# Altium footprint library Vowstar_IC_General.PcbLib: 139 footprints (part 1 of 9)
Each footprint in its own frame and in the unit in brackets; x right, y up, seen from the top. Pads: shape width x height; smd on the part's side, far side on the other; paste and mask are expansions set on the pad; w line width, h text height; cw(c..) or ccw(c..) is an arc to the next point about the centre after c.
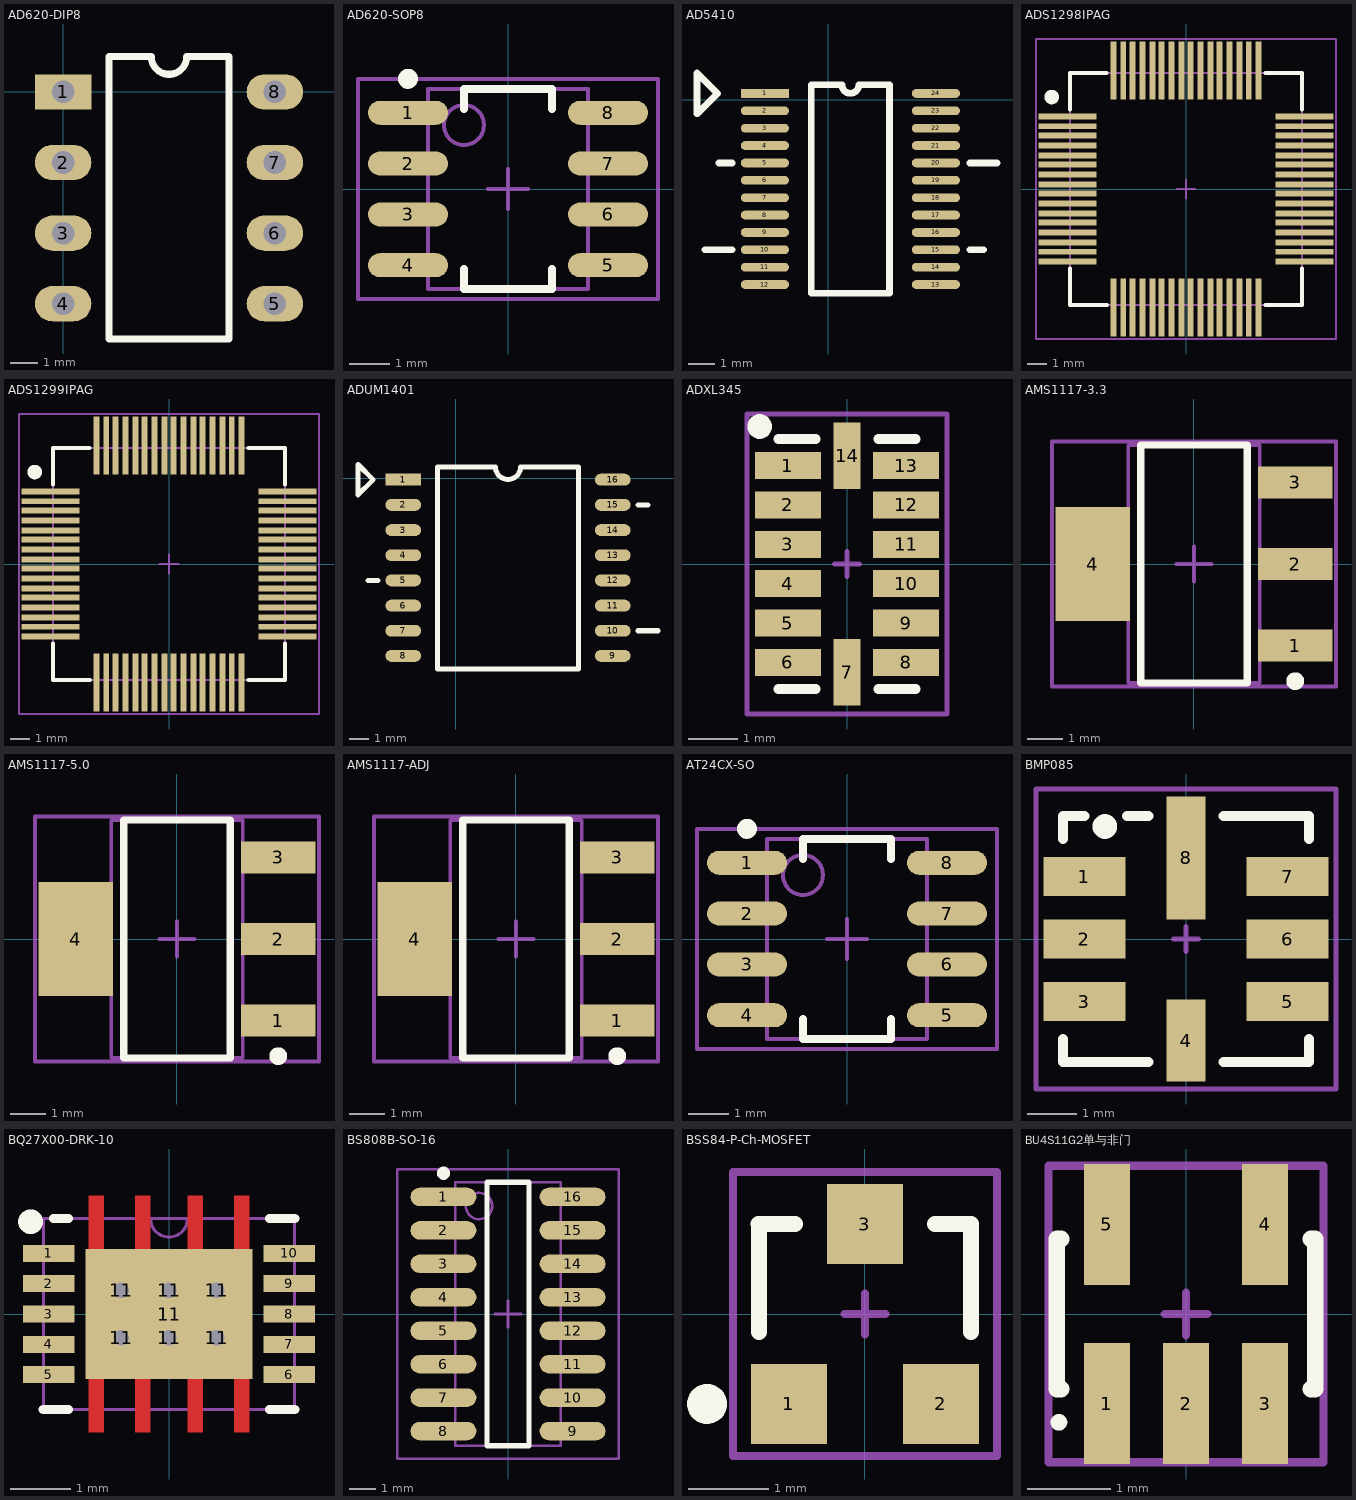
[diagram p0: the footprints below, top view; thin cyan lines are the x and y axes]

## AD620-DIP8 [mil] "AD620-DIP8"
pads (8):
  rect 80x50 hole 32: 1(0,0)
  oval 80x50 hole 32: 2(0,-100) 3(0,-200) 4(0,-300) 5(300,-300) 6(300,-200) 7(300,-100) 8(300,0)
Top Overlay:
  lines w10: 65,-350 235,-350 235,50 175,50 cw(c150,50) 125,50 65,50 65,-350
3D body "User Library-DIP-8-300-metric.step": height 177.17, standoff -137.8, extent -3,-362.6 302.54,62.6

## AD620-SOP8 [mm] "AD620-SOP8"
height 1.5
pads (8):
  oval 2x0.6 smd: 1(-2.5,1.905) 2(-2.5,0.635) 3(-2.5,-0.635) 4(-2.5,-1.905) 5(2.5,-1.905) 6(2.5,-0.635) 7(2.5,0.635) 8(2.5,1.905)
Top Overlay:
  circle w0.25: c-2.5,2.755 r0.125
  lines w0.2: -1.1,-2 -1.1,-2.5 1.1,-2.5 1.1,-2 ; -1.1,2 -1.1,2.5 1.1,2.5 1.1,2
Mechanical 13:
  circle w0.1: c-1.1,1.6 r0.5
  lines w0.1: -2,-2.5 2,-2.5 2,2.5 -2,2.5 -2,-2.5
Mechanical 15:
  lines w0.1: -0.5,0 0.5,0 ; 0,-0.5 0,0.5 ; -3.75,-2.75 3.75,-2.75 3.75,2.75 -3.75,2.75 -3.75,-2.75
3D body "User Library-SOP-8.step": height 1.45, standoff 0, extent -2.921,-2.451 2.857,2.451

## AD5410 [mm]
pads (24):
  rect 1.8x0.33 smd: 1(-2.371,0.238)
  oval 1.8x0.33 smd: 2(-2.371,-0.412) 3(-2.371,-1.062) 4(-2.371,-1.712) 5(-2.371,-2.362) 6(-2.371,-3.012) 7(-2.371,-3.662) 8(-2.371,-4.312) 9(-2.371,-4.962) 10(-2.371,-5.612) 11(-2.371,-6.262) 12(-2.371,-6.912) 13(4.029,-6.912) 14(4.029,-6.262) 15(4.029,-5.612) 16(4.029,-4.962) 17(4.029,-4.312) 18(4.029,-3.662) 19(4.029,-3.012) 20(4.029,-2.362) 21(4.029,-1.712) 22(4.029,-1.062) 23(4.029,-0.412) 24(4.029,0.238)
Top Overlay:
  lines w0.254: -4.607,-5.612 -3.591,-5.612 ; -4.099,-2.362 -3.591,-2.362 ; 5.299,-5.612 5.807,-5.612 ; 5.299,-2.362 6.315,-2.362 ; -4.911,-0.524 -4.149,0.238 -4.911,1 -4.911,-0.524 ; -0.636,-7.237 -0.636,0.563 0.511,0.563 ccw(c0.829,0.563) 1.146,0.563 2.294,0.563 2.294,-7.237 -0.636,-7.237

## ADS1298IPAG [mil] "ADS1298IPAG"
height 41.34
pads (64):
  rect 118x12 smd: 1(-240.5,147.5) 2(-240.5,127.5) 3(-240.5,108.5) 4(-240.5,88.5) 5(-240.5,68.5) 6(-240.5,49.5) 7(-240.5,29.5) 8(-240.5,9.5) 9(-240.5,-9.5) 10(-240.5,-29.5) 11(-240.5,-49.5) 12(-240.5,-68.5) 13(-240.5,-88.5) 14(-240.5,-108.5) 15(-240.5,-127.5) 16(-240.5,-147.5) 33(240.5,-147.5) 34(240.5,-127.5) 35(240.5,-108.5) 36(240.5,-88.5) 37(240.5,-68.5) 38(240.5,-49.5) 39(240.5,-29.5) 40(240.5,-9.5) 41(240.5,9.5) 42(240.5,29.5) 43(240.5,49.5) 44(240.5,68.5) 45(240.5,88.5) 46(240.5,108.5) 47(240.5,127.5) 48(240.5,147.5)
  rect 12x118 smd: 17(-147.5,-240.5) 18(-127.5,-240.5) 19(-108.5,-240.5) 20(-88.5,-240.5) 21(-68.5,-240.5) 22(-49.5,-240.5) 23(-29.5,-240.5) 24(-9.5,-240.5) 25(9.5,-240.5) 26(29.5,-240.5) 27(49.5,-240.5) 28(68.5,-240.5) 29(88.5,-240.5) 30(108.5,-240.5) 31(127.5,-240.5) 32(147.5,-240.5) 49(147.5,240.5) 50(127.5,240.5) 51(108.5,240.5) 52(88.5,240.5) 53(68.5,240.5) 54(49.5,240.5) 55(29.5,240.5) 56(9.5,240.5) 57(-9.5,240.5) 58(-29.5,240.5) 59(-49.5,240.5) 60(-68.5,240.5) 61(-88.5,240.5) 62(-108.5,240.5) 63(-127.5,240.5) 64(-147.5,240.5)
Top Overlay:
  circle w19.68: c-273,187 r4.92
  lines w7.87: -236.22,-161.22 -236.22,-236.22 -160,-236.22 ; -236.22,161.22 -236.22,236.22 -161.22,236.22 ; 161.22,-236.22 236.22,-236.22 236.22,-161.22 ; 161.22,236.22 236.22,236.22 236.22,161.22
Mechanical 13:
  lines w3.94: -236.22,-236.22 236.22,-236.22 236.22,236.22 -236.22,236.22 -236.22,-236.22
Mechanical 15:
  lines w3.94: -19.69,0 19.68,0 ; 0,-19.68 0,19.69 ; -305,-305 305,-305 305,305 -305,305 -305,-305
3D body "User Library-QFP-64.step": height 53.15, standoff 0, extent -236.77,-236.76 236.77,236.77

## ADS1299IPAG [mil] "ADS1299IPAG,Low-Noise, 8-Channel, 24-Bit Analog Front-End for Biopotential Measurements"
height 41.34
pads (64):
  rect 118x12 smd: 1(-240.5,147.5) 2(-240.5,127.5) 3(-240.5,108.5) 4(-240.5,88.5) 5(-240.5,68.5) 6(-240.5,49.5) 7(-240.5,29.5) 8(-240.5,9.5) 9(-240.5,-9.5) 10(-240.5,-29.5) 11(-240.5,-49.5) 12(-240.5,-68.5) 13(-240.5,-88.5) 14(-240.5,-108.5) 15(-240.5,-127.5) 16(-240.5,-147.5) 33(240.5,-147.5) 34(240.5,-127.5) 35(240.5,-108.5) 36(240.5,-88.5) 37(240.5,-68.5) 38(240.5,-49.5) 39(240.5,-29.5) 40(240.5,-9.5) 41(240.5,9.5) 42(240.5,29.5) 43(240.5,49.5) 44(240.5,68.5) 45(240.5,88.5) 46(240.5,108.5) 47(240.5,127.5) 48(240.5,147.5)
  rect 12x118 smd: 17(-147.5,-240.5) 18(-127.5,-240.5) 19(-108.5,-240.5) 20(-88.5,-240.5) 21(-68.5,-240.5) 22(-49.5,-240.5) 23(-29.5,-240.5) 24(-9.5,-240.5) 25(9.5,-240.5) 26(29.5,-240.5) 27(49.5,-240.5) 28(68.5,-240.5) 29(88.5,-240.5) 30(108.5,-240.5) 31(127.5,-240.5) 32(147.5,-240.5) 49(147.5,240.5) 50(127.5,240.5) 51(108.5,240.5) 52(88.5,240.5) 53(68.5,240.5) 54(49.5,240.5) 55(29.5,240.5) 56(9.5,240.5) 57(-9.5,240.5) 58(-29.5,240.5) 59(-49.5,240.5) 60(-68.5,240.5) 61(-88.5,240.5) 62(-108.5,240.5) 63(-127.5,240.5) 64(-147.5,240.5)
Top Overlay:
  circle w19.68: c-273,187 r4.92
  lines w7.87: -236.22,-161.22 -236.22,-236.22 -160,-236.22 ; -236.22,161.22 -236.22,236.22 -161.22,236.22 ; 161.22,-236.22 236.22,-236.22 236.22,-161.22 ; 161.22,236.22 236.22,236.22 236.22,161.22
Mechanical 13:
  lines w3.94: -236.22,-236.22 -236.22,236.22 236.22,236.22 236.22,-236.22 -236.22,-236.22
Mechanical 15:
  lines w3.94: -19.69,0 19.68,0 ; 0,-19.68 0,19.69 ; -305,-305 -305,305 305,305 305,-305 -305,-305
3D body "User Library-QFP-64.step": height 53.15, standoff 0, extent -236.77,-236.76 236.77,236.77

## ADUM1401 [mm] "ADUM1401"
pads (16):
  rect 1.8x0.6 smd: 1(-2.65,-0.083)
  oval 1.8x0.6 smd: 2(-2.65,-1.353) 3(-2.65,-2.623) 4(-2.65,-3.893) 5(-2.65,-5.163) 6(-2.65,-6.433) 7(-2.65,-7.703) 8(-2.65,-8.973) 9(7.91,-8.973) 10(7.91,-7.703) 11(7.91,-6.433) 12(7.91,-5.163) 13(7.91,-3.893) 14(7.91,-2.623) 15(7.91,-1.353) 16(7.91,-0.083)
Top Overlay:
  lines w0.254: -4.428,-5.163 -3.92,-5.163 ; 9.18,-7.703 10.196,-7.703 ; 9.18,-1.353 9.688,-1.353 ; -4.936,-0.845 -4.174,-0.083 -4.936,0.679 -4.936,-0.845 ; -0.915,-9.623 6.175,-9.623 6.175,0.567 3.265,0.567 cw(c2.63,0.567) 1.995,0.567 -0.915,0.567 -0.915,-9.623

## ADXL345 [mm] "ADXL345 SMD Digital Accelerometer"
height 1
pads (14):
  rect 1.345x0.55 smd: 1(-1.199,2) 2(-1.199,1.2) 3(-1.199,0.4) 4(-1.199,-0.4) 5(-1.199,-1.2) 6(-1.199,-2) 8(1.199,-2) 9(1.199,-1.2) 10(1.199,-0.4) 11(1.199,0.4) 12(1.199,1.2) 13(1.199,2)
  rect 0.55x1.345 smd: 7(0,-2.199) 14(0,2.199)
Top Overlay:
  circle w0.25: c-1.776,2.794 r0.125
  lines w0.2: -1.397,-2.54 -0.635,-2.54 ; -1.397,2.54 -0.635,2.54 ; 0.635,-2.54 1.397,-2.54 ; 0.635,2.54 1.397,2.54
Mechanical 15:
  lines w0.1: -0.254,0 0.254,0 ; 0,-0.254 0,0.254 ; -2.032,-3.048 2.032,-3.048 2.032,3.048 -2.032,3.048 -2.032,-3.048
3D body "User Library-LGA-14-1.step": height 0.98, standoff 0, extent -1.501,-2.5 1.499,2.5

## AMS1117-3.3 [mm] "AMS1117-3.3"
height 1.8
pads (4):
  rect 2.1x0.9 smd: 1(2.85,-2.3) 2(2.85,0) 3(2.85,2.3)
  rect 2.1x3.2 smd: 4(-2.85,0)
Top Overlay:
  circle w0.25: c2.85,-3.3 r0.125
  lines w0.2: -1.5,-3.35 -1.5,3.35 1.5,3.35 1.5,-3.35 -1.5,-3.35
Mechanical 13:
  lines w0.1: -1.85,-3.35 -1.85,3.35 1.85,3.35 1.85,-3.35 -1.85,-3.35
Mechanical 15:
  lines w0.1: -0.5,0 0.5,0 ; 0,-0.5 0,0.5 ; -4,-3.45 -4,3.45 4,3.45 4,-3.45 -4,-3.45
3D body "User Library-AMS1117-SOT223.step": height 1.82, standoff -0.04, extent -3.531,-3.25 3.469,3.25

## AMS1117-5.0 [mm] "AMS1117-5.0"
height 1.8
pads (4):
  rect 2.1x0.9 smd: 1(2.85,-2.3) 2(2.85,0) 3(2.85,2.3)
  rect 2.1x3.2 smd: 4(-2.85,0)
Top Overlay:
  circle w0.25: c2.85,-3.3 r0.125
  lines w0.2: -1.5,-3.35 1.5,-3.35 1.5,3.35 -1.5,3.35 -1.5,-3.35
Mechanical 13:
  lines w0.1: -1.85,-3.35 1.85,-3.35 1.85,3.35 -1.85,3.35 -1.85,-3.35
Mechanical 15:
  lines w0.1: -0.5,0 0.5,0 ; 0,-0.5 0,0.5 ; -4,-3.45 4,-3.45 4,3.45 -4,3.45 -4,-3.45
3D body "User Library-AMS1117-SOT223.step": height 1.82, standoff -0.04, extent -3.531,-3.25 3.469,3.25

## AMS1117-ADJ [mm] "AMS1117-ADJ"
height 1.8
pads (4):
  rect 2.1x0.9 smd: 1(2.85,-2.3) 2(2.85,0) 3(2.85,2.3)
  rect 2.1x3.2 smd: 4(-2.85,0)
Top Overlay:
  circle w0.25: c2.85,-3.3 r0.125
  lines w0.2: -1.5,-3.35 -1.5,3.35 1.5,3.35 1.5,-3.35 -1.5,-3.35
Mechanical 13:
  lines w0.1: -1.85,-3.35 -1.85,3.35 1.85,3.35 1.85,-3.35 -1.85,-3.35
Mechanical 15:
  lines w0.1: -0.5,0 0.5,0 ; 0,-0.5 0,0.5 ; -4,-3.45 -4,3.45 4,3.45 4,-3.45 -4,-3.45
3D body "User Library-AMS1117-SOT223.step": height 1.82, standoff -0.04, extent -3.531,-3.25 3.469,3.25

## AT24CX-SO [mm] "AT24CX"
pads (8):
  oval 2x0.6 smd: 1(-2.5,1.905) 2(-2.5,0.635) 3(-2.5,-0.635) 4(-2.5,-1.905) 5(2.5,-1.905) 6(2.5,-0.635) 7(2.5,0.635) 8(2.5,1.905)
Top Overlay:
  circle w0.25: c-2.5,2.755 r0.125
  lines w0.2: -1.1,-2 -1.1,-2.5 1.1,-2.5 1.1,-2 ; -1.1,2 -1.1,2.5 1.1,2.5 1.1,2
Mechanical 13:
  circle w0.1: c-1.1,1.6 r0.5
  lines w0.1: -2,-2.5 -2,2.5 2,2.5 2,-2.5 -2,-2.5
Mechanical 15:
  lines w0.1: -0.5,0 0.5,0 ; 0,-0.5 0,0.5 ; -3.75,-2.75 -3.75,2.75 3.75,2.75 3.75,-2.75 -3.75,-2.75
3D body "User Library-SOP-8.step": height 1.45, standoff 0, extent -2.921,-2.451 2.857,2.451

## BMP085 [mm] "BMP085 SMD Digital barometric pressure sensor"
height 1.32
pads (8):
  rect 1.67x0.8 smd: 1(-2.065,1.27) 2(-2.065,0) 3(-2.065,-1.27) 5(2.065,-1.27) 6(2.065,0) 7(2.065,1.27)
  rect 0.8x1.67 smd: 4(0,-2.065)
  rect 0.8x2.5 smd: 8(0,1.65)
Top Overlay:
  circle w0.25: c-1.649,2.286 r0.125
  lines w0.2: -2.5,-2.032 -2.5,-2.5 -0.762,-2.5 ; -2.5,2.032 -2.5,2.5 -2.066,2.5 ; -1.197,2.5 -0.762,2.5 ; 0.762,-2.5 2.5,-2.5 2.5,-2.032 ; 0.762,2.5 2.5,2.5 2.5,2.032
Mechanical 15:
  lines w0.1: -0.254,0 0.254,0 ; 0,-0.254 0,0.254 ; -3.048,-3.048 -3.048,3.048 3.048,3.048 3.048,-3.048 -3.048,-3.048
3D body "User Library-BMP085-Barometer.step": height 1.22, standoff 0.01, extent -2.5,-2.46 2.5,2.54

## BQ27X00-DRK-10 [mm] "BQ27200,BQ27000 DRK(S-PVSON-N10)"
height 1
pads (17):
  rect 0.85x0.28 smd paste-0.412: 1(-1.981,1) 2(-1.981,0.5) 3(-1.981,0) 4(-1.981,-0.5) 5(-1.981,-1) 6(1.981,-1) 7(1.981,-0.5) 8(1.981,0) 9(1.981,0.5) 10(1.981,1)
  round 0.508 / inner round 1.524 / far side round 0.508 hole 0.254: 11(-0.787,-0.394) 11(-0.787,0.394) 11(0,-0.394) 11(0,0.394) 11(0.787,-0.394) 11(0.787,0.394)
  rect 2.75x2.15 smd paste-1.362 mask-1.359: 11(0,0)
Top Layer:
  region: -0.31,1.95 -0.31,1.075 -0.56,1.075 -0.56,1.95
  region: 0.31,1.95 0.31,1.075 0.56,1.075 0.56,1.95
  region: -1.075,1.95 -1.075,1.075 -1.325,1.075 -1.325,1.95
  region: 1.075,1.95 1.075,1.075 1.325,1.075 1.325,1.95
  region: -0.31,-1.95 -0.31,-1.075 -0.56,-1.075 -0.56,-1.95
  region: 0.31,-1.95 0.31,-1.075 0.56,-1.075 0.56,-1.95
  region: -1.075,-1.95 -1.075,-1.075 -1.325,-1.075 -1.325,-1.95
  region: 1.075,-1.95 1.075,-1.075 1.325,-1.075 1.325,-1.95
Top Overlay:
  circle w0.254: c-2.286,1.524 r0.076
  lines w0.152: -2.075,-1.575 -1.658,-1.575 ; -1.905,1.575 -1.658,1.575 ; 1.658,-1.575 2.075,-1.575 ; 1.658,1.575 2.075,1.575
Top Paste:
  drawing of 30 lines, arcs and shapes, not listed
Top Solder:
  region: -1.486,1.21 -2.476,1.21 -2.476,0.79 -1.486,0.79
  region: -1.486,0.71 -2.476,0.71 -2.476,0.29 -1.486,0.29
  region: -1.486,0.21 -2.476,0.21 -2.476,-0.21 -1.486,-0.21
  region: -1.486,-0.29 -2.476,-0.29 -2.476,-0.71 -1.486,-0.71
  region: -1.486,-0.79 -2.476,-0.79 -2.476,-1.21 -1.486,-1.21
  region: 2.476,-0.79 1.486,-0.79 1.486,-1.21 2.476,-1.21
  region: 2.476,-0.29 1.486,-0.29 1.486,-0.71 2.476,-0.71
  region: 2.476,0.21 1.486,0.21 1.486,-0.21 2.476,-0.21
  region: 2.476,0.71 1.486,0.71 1.486,0.29 2.476,0.29
  region: 2.476,1.21 1.486,1.21 1.486,0.79 2.476,0.79
  region: -0.31,1.95 -0.31,1.075 -0.56,1.075 -0.56,1.95
  region: 0.31,1.95 0.31,1.075 0.56,1.075 0.56,1.95
  region: -1.075,1.95 -1.075,1.075 -1.325,1.075 -1.325,1.95
  region: 1.075,1.95 1.075,1.075 1.325,1.075 1.325,1.95
  region: -0.31,-1.95 -0.31,-1.075 -0.56,-1.075 -0.56,-1.95
  region: 0.31,-1.95 0.31,-1.075 0.56,-1.075 0.56,-1.95
  region: -1.075,-1.95 -1.075,-1.075 -1.325,-1.075 -1.325,-1.95
  region: 1.075,-1.95 1.075,-1.075 1.325,-1.075 1.325,-1.95
  region: -1.439,0.594 -1.439,1.138 1.439,1.138 1.439,0.594
  region: -1.439,-0.194 -1.439,0.194 1.439,0.194 1.439,-0.194
  region: -1.439,-1.138 -1.439,-0.594 1.439,-0.594 1.439,-1.138
  region: -1.439,-1.138 -1.439,1.138 -0.987,1.138 -0.987,-1.138
  region: -0.2,-1.138 -0.2,1.138 -0.587,1.138 -0.587,-1.138
  region: 0.587,-1.138 0.587,1.138 0.2,1.138 0.2,-1.138
  region: 0.987,-1.138 0.987,1.138 1.439,1.138 1.439,-1.138
Mechanical 13:
  lines w0.051: -0.305,1.575 ccw(c0,1.575) 0.305,1.575 ; -2.075,-1.575 2.075,-1.575 2.075,1.575 -2.075,1.575 -2.075,-1.575 ; -2.075,-1.15 -2.075,-0.85 -2.075,-1.15 ; -2.075,-0.65 -2.075,-0.35 -2.075,-0.65 ; -2.075,-0.15 -2.075,0.15 -2.075,-0.15 ; -2.075,0.35 -2.075,0.65 -2.075,0.35 ; -2.075,0.85 -2.075,1.15 -2.075,0.85 ; 2.075,-1.15 2.075,-0.85 2.075,-1.15 ; 2.075,-0.65 2.075,-0.35 2.075,-0.65 ; 2.075,-0.15 2.075,0.15 2.075,-0.15 ; 2.075,0.35 2.075,0.65 2.075,0.35 ; 2.075,0.85 2.075,1.15 2.075,0.85
3D body: height 1, standoff 0, extent -2.083,-1.575 2.083,1.575
3D body: height 1.01, standoff 0, extent -1.976,1.07 -1.578,1.47

## BS808B-SO-16 [mm] "16-Pin Small Outline Integrated Circuit 1.27 mm Pitch, IPC Low Density"
height 1.75
pads (16):
  oval 2.5x0.7 smd: 1(-2.45,4.445) 2(-2.45,3.175) 3(-2.45,1.905) 4(-2.45,0.635) 5(-2.45,-0.635) 6(-2.45,-1.905) 7(-2.45,-3.175) 8(-2.45,-4.445) 9(2.45,-4.445) 10(2.45,-3.175) 11(2.45,-1.905) 12(2.45,-0.635) 13(2.45,0.635) 14(2.45,1.905) 15(2.45,3.175) 16(2.45,4.445)
Top Overlay:
  circle w0.25: c-2.45,5.345 r0.125
  lines w0.2: -0.8,-5 -0.8,5 0.8,5 0.8,-5 -0.8,-5
Mechanical 13:
  circle w0.1: c-1.1,4.1 r0.5
  lines w0.1: -2,-5 -2,5 2,5 2,-5 -2,-5
Mechanical 15:
  lines w0.1: -0.5,0 0.5,0 ; 0,-0.5 0,0.5 ; -4.2,-5.5 -4.2,5.5 4.2,5.5 4.2,-5.5 -4.2,-5.5
3D body "User Library-SOP-16.step": height 1.45, standoff 0, extent -2.946,-5.004 2.959,4.978

## BSS84-P-Ch-MOSFET [mm] "BSS84-P-Ch-MOSFET"
height 0.9
pads (3):
  rect 0.95x1 smd: 1(-0.95,-1.125) 2(0.95,-1.125) 3(0,1.125)
Top Overlay:
  circle w0.25: c-1.975,-1.125 r0.125
  lines w0.2: -1.328,1.125 -0.875,1.125 ; -1.325,-0.225 -1.325,1.125 ; 0.875,1.125 1.325,1.125 1.325,-0.225
Mechanical 15:
  lines w0.1: -0.254,0 0.254,0 ; 0,-0.254 0,0.254 ; -1.651,-1.778 -1.651,1.778 1.651,1.778 1.651,-1.778 -1.651,-1.778
3D body "User Library-SOT23-3.step": height 1.3, standoff 0, extent -1.448,-1.397 1.452,1.403

## BU4S11G2单与非门 [mm] "BU4S11G2单与非门"
height 1.25
pads (5):
  rect 0.55x1.45 smd: 1(-0.95,-1.075) 2(0,-1.075) 3(0.95,-1.075) 4(0.95,1.075) 5(-0.95,1.075)
Top Overlay:
  circle w0.1: c-1.525,-1.3 r0.05
  lines w0.2: -1.5,-0.9 -1.55,-0.9 -1.55,0.9 -1.5,0.9 ; 1.5,-0.9 1.55,-0.9 1.55,0.9 1.5,0.9
Mechanical 15:
  lines w0.1: -0.254,0 0.254,0 ; 0,-0.254 0,0.254 ; -1.651,-1.778 -1.651,1.778 1.651,1.778 1.651,-1.778 -1.651,-1.778
3D body "User Library-SOT23-5.step": height 1.45, standoff 0, extent -1.448,-1.397 1.452,1.403